# Altium footprint library Angler.PcbLib: 331 footprints (part 12 of 21)
Each footprint in its own frame and in the unit in brackets; x right, y up, seen from the top. Pads: shape width x height; smd on the part's side, far side on the other; paste and mask are expansions set on the pad; w line width, h text height; cw(c..) or ccw(c..) is an arc to the next point about the centre after c.
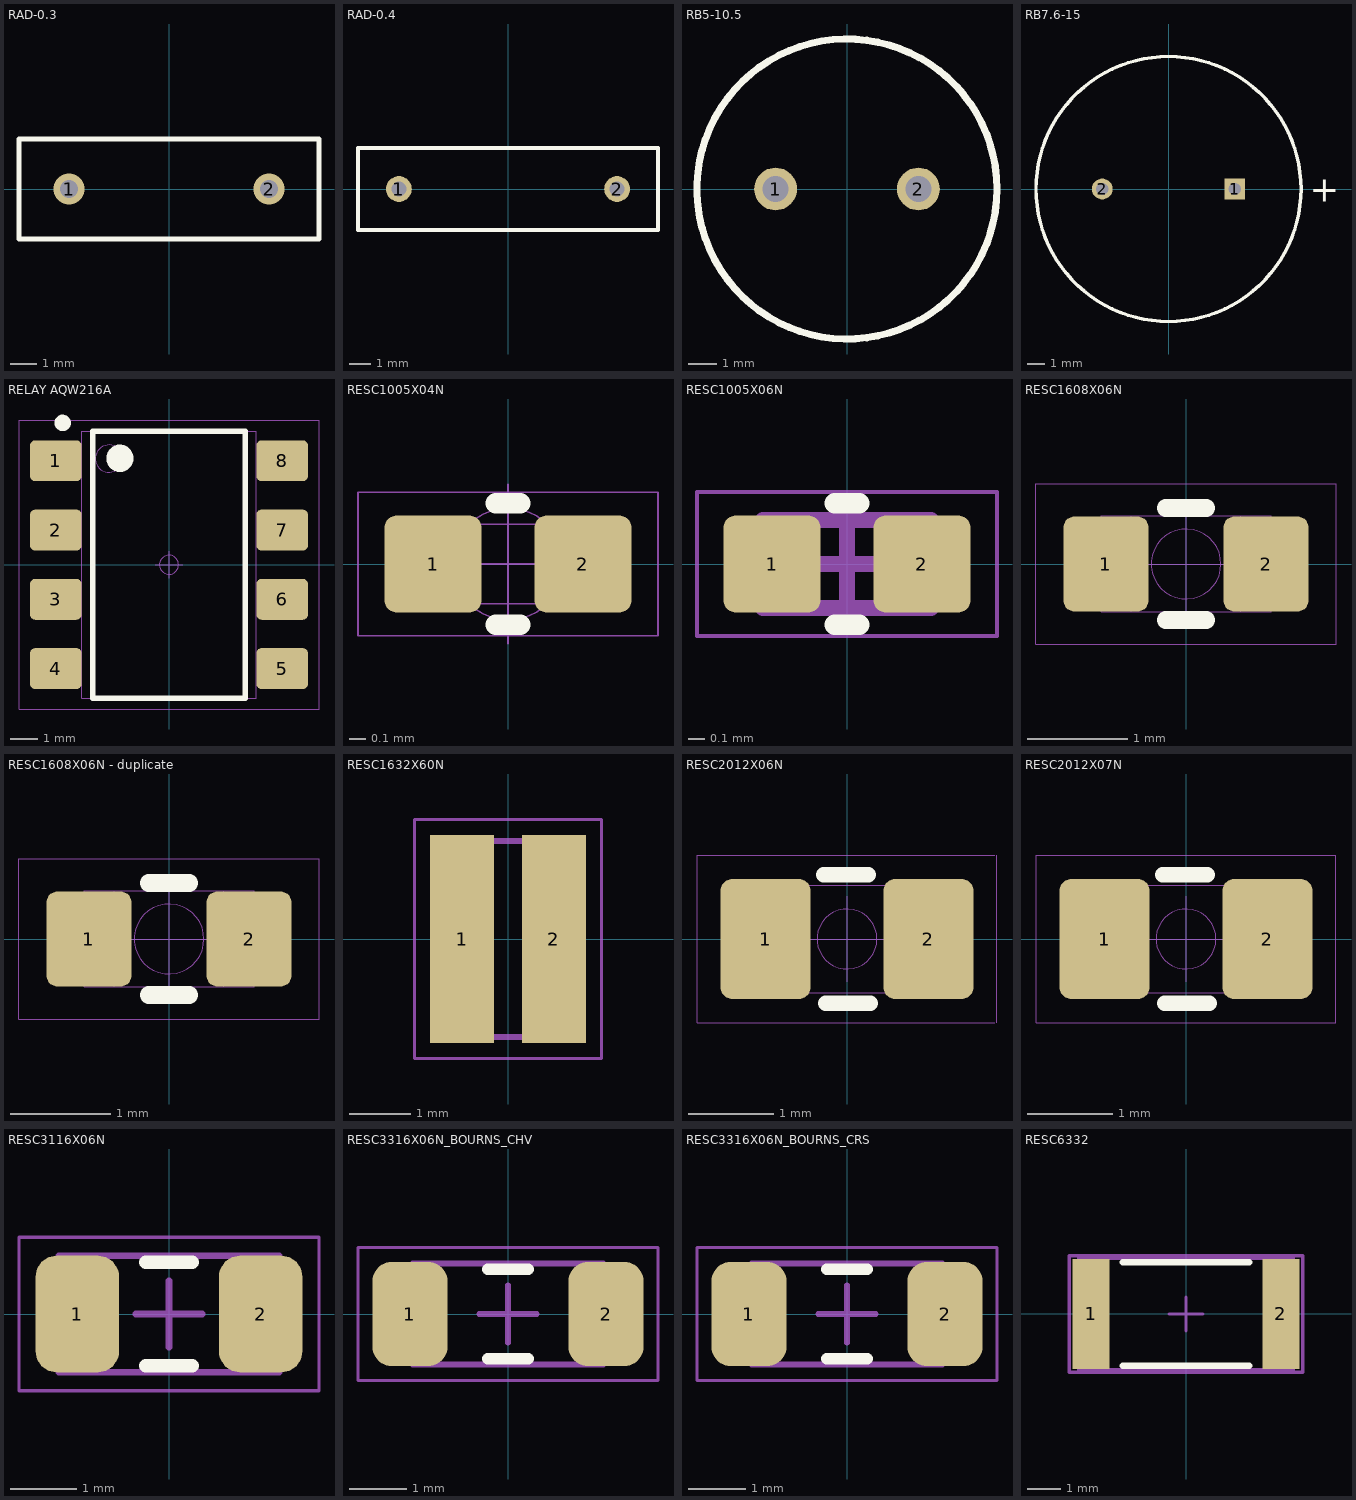
[diagram p11: the footprints below, top view; thin cyan lines are the x and y axes]

## RAD-0.3 [mm] "Radial Cap, Thru-Hole; 2 Leads; 0.3 in Pin Spacing"
height 6
pads (2):
  round 1.2 hole 0.7: 1(-3.81,0) 2(3.81,0)
Top Overlay:
  lines w0.2: -5.715,-1.905 -5.715,1.905 5.715,1.905 5.715,-1.905 -5.715,-1.905

## RAD-0.4 [mm] "Radial Cap, Thru-Hole; 2 Leads; 0.4 in Pin Spacing"
pads (2):
  round 1.2 hole 0.7: 1(-5.08,0) 2(5.08,0)
Top Overlay:
  lines w0.2: -6.985,-1.905 6.985,-1.905 6.985,1.905 -6.985,1.905 -6.985,-1.905

## RB5-10.5 [mm] "Capacitor (Radial); 2 Leads"
pads (2):
  round 1.5 hole 0.9: 1(-2.5,0) 2(2.5,0)
Top Overlay:
  circle w0.25: c0,0 r5.25
Mechanical 1:
  circle w0.02: c0,0 r5.25

## RB7.6-15 [mm] "Polarized Capacitor (Radial); 2 Leads"
pads (2):
  rect 1.2x1.2 hole 0.7: 1(3.81,0)
  round 1.2 hole 0.7: 2(-3.81,0)
Top Overlay:
  circle w0.2: c0,0 r7.62
  text "+" at 8.132,-0.737 h1.5

## RELAY AQW216A [mm] "Compact DIP8-pin type, SMD"
height 3.6
pads (8):
  rrect25% 1.9x1.5 smd mask+0.064: 1(-4.15,3.81) 2(-4.15,1.27) 3(-4.15,-1.27) 4(-4.15,-3.81) 5(4.15,-3.81) 6(4.15,-1.27) 7(4.15,1.27) 8(4.15,3.81)
Top Overlay:
  circle w0.5: c-1.8,3.9 r0.25
  circle w0.3: c-3.9,5.2 r0.15
  lines w0.2: -2.8,-4.89 -2.8,4.89 2.8,4.89 2.8,-4.89 -2.8,-4.89
Mechanical 9:
  circle w0.01: c-2.2,3.89 r0.5
  lines w0.01: -3.2,-4.89 3.2,-4.89 3.2,4.89 -3.2,4.89 -3.2,-4.89
Mechanical 11:
  text ".Designator" at -2.8,-1.1 h3
Mechanical 15:
  circle w0.01: c0,0 r0.35
  lines w0.01: -0.5,0 0.5,0 ; 0,-0.5 0,0.5 ; -5.5,-5.3 -5.5,5.3 5.5,5.3 5.5,-5.3 -5.5,-5.3
3D body: height 3.6, standoff 0.2, extent -3.2,-4.89 3.2,4.89

## RESC1005X04N [mil] "0402, Body 1.0x0.5x0.4mmmm, IPC Medium Density"
height 15.75
pads (2):
  rrect25% 24x24 smd paste+0 mask+2: 1(-18.5,0) 2(18.5,0)
Top Overlay:
  lines w5: -3.01,-15.01 2.99,-15.01 ; -3,15 3,15
Mechanical 9:
  lines w0.39: -7.87,-9.84 -7.87,9.84 ; 7.87,-9.84 7.87,9.84 ; -21.65,-9.84 21.65,-9.84 21.65,9.84 -21.65,9.84 -21.65,-9.84
Mechanical 11:
  text ".Designator" at -15.75,-3.94 h19.68
Mechanical 15:
  circle w0.39: c0,0 r13.78
  lines w0.39: -19.68,0 19.68,0 ; 0,-19.68 0,19.68 ; -37,-17.72 -37,17.72 37,17.72 37,-17.72 -37,-17.72
3D body "RESC1005X04N.step": height 15.75, standoff 0, extent -20.67,-10.82 20.67,10.83

## RESC1005X06N [mil] "0402, Body 1.00x0.50mx0.55m, IPC Medium Density"
height 21.65
pads (2):
  rrect25% 24x24 smd mask+2: 1(-18.5,0) 2(18.5,0)
Top Overlay:
  lines w5: -3.01,-15.01 2.99,-15.01 ; -3,15 3,15
Mechanical 9:
  lines w3.94: -20.67,-10.83 20.67,-10.83 20.67,10.83 -20.67,10.83 -20.67,-10.83
Mechanical 11:
  text "'.Designator'" at -9.84,-2.95 h4.92
Mechanical 15:
  lines w1: -37,-17.72 37,-17.72 37,17.72 -37,17.72 -37,-17.72
  lines w3.94: -10.83,0 10.83,0 ; 0,-10.83 0,10.83
3D body "RESC1005X06N.step": height 21.65, standoff 0, extent -20.67,-10.83 20.67,10.83

## RESC1608X06N [mm] "0603, Body 1.5x0.8x0.55mm, IPC Medium Density"
height 0.55
pads (2):
  rrect25% 0.85x0.95 smd paste+0 mask+0.064: 1(-0.8,0) 2(0.8,0)
Top Overlay:
  lines w0.178: -0.203,-0.559 0.203,-0.559 ; -0.203,0.559 0.203,0.559
Mechanical 9:
  lines w0.01: -0.55,-0.48 -0.55,0.475 ; 0.55,-0.48 0.55,0.475 ; -0.85,-0.48 -0.85,0.48 0.85,0.48 0.85,-0.48 -0.85,-0.48
Mechanical 11:
  text ".Designator" at -0.8,-0.3 h1
Mechanical 15:
  circle w0.01: c0,0 r0.35
  lines w0.01: -0.5,0 0.5,0 ; 0,-0.5 0,0.5 ; -1.5,-0.8 1.5,-0.8 1.5,0.8 -1.5,0.8 -1.5,-0.8
3D body "RESC1608X06N.step": height 0.55, standoff 0, extent -0.85,-0.45 0.85,0.45

## RESC1608X06N - duplicate [mm] "0603, Body 1.5x0.8x0.55mm, IPC Medium Density"
height 0.55
pads (2):
  rrect25% 0.85x0.95 smd paste+0 mask+0.064: 1(-0.8,0) 2(0.8,0)
Top Overlay:
  lines w0.178: -0.203,-0.559 0.203,-0.559 ; -0.203,0.559 0.203,0.559
Mechanical 9:
  lines w0.01: -0.55,-0.48 -0.55,0.475 ; 0.55,-0.48 0.55,0.475 ; -0.85,-0.48 -0.85,0.48 0.85,0.48 0.85,-0.48 -0.85,-0.48
Mechanical 11:
  text ".Designator" at -0.8,-0.3 h1
Mechanical 15:
  circle w0.01: c0,0 r0.35
  lines w0.01: -0.5,0 0.5,0 ; 0,-0.5 0,0.5 ; -1.5,-0.8 1.5,-0.8 1.5,0.8 -1.5,0.8 -1.5,-0.8
3D body "RESC1608X06N.step": height 0.55, standoff 0, extent -0.85,-0.45 0.85,0.45

## RESC1632X60N [mm]
pads (2):
  rect 1.05x3.4 smd: 1(-0.75,0) 2(0.75,0)
Mechanical 13:
  lines w0.1: -0.8,-1.6 0.8,-1.6 0.8,1.6 -0.8,1.6 -0.8,-1.6
Mechanical 15:
  lines w0.05: -1.525,-1.95 1.525,-1.95 1.525,1.95 -1.525,1.95 -1.525,-1.95
3D body "PRL1632-R013-F-T1.stp": height 0.6, standoff 0, extent -0.8,-1.6 0.8,1.6

## RESC2012X06N [mm] "0805, Body 2.0x1.3x0.6mm, IPC Medium Density"
height 0.6
pads (2):
  rrect25% 1.05x1.4 smd paste+0 mask+0.064: 1(-0.95,0) 2(0.95,0)
Top Overlay:
  lines w0.178: -0.275,0.75 0.25,0.75 ; -0.25,-0.75 0.275,-0.75
Mechanical 9:
  lines w0.01: -0.8,-0.625 -0.8,0.625 ; 0.8,-0.625 0.8,0.625 ; -1.1,-0.625 -1.1,0.625 1.1,0.625 1.1,-0.625 -1.1,-0.625
Mechanical 11:
  text "'.Designator'" at -0.8,-0.3 h0.5
Mechanical 15:
  circle w0.01: c0,0 r0.35
  lines w0.01: -0.5,0 0.5,0 ; 0,-0.5 0,0.5 ; 1.725,-0.975 -1.75,-0.975 -1.75,0.975 1.725,0.975 ; 1.75,-0.975 1.75,0.975
3D body "RESC2012X06N.step": height 0.6, standoff 0, extent -1.1,-0.675 1.1,0.675

## RESC2012X07N [mm] "0805, Body 2.0x1.3x0.7mm, IPC Medium Density"
height 0.7
pads (2):
  rrect25% 1.05x1.4 smd paste+0 mask+0.064: 1(-0.95,0) 2(0.95,0)
Top Overlay:
  lines w0.178: -0.275,0.75 0.25,0.75 ; -0.25,-0.75 0.275,-0.75
Mechanical 9:
  lines w0.01: -0.8,-0.625 -0.8,0.625 ; 0.8,-0.625 0.8,0.625 ; -1.1,-0.625 -1.1,0.625 1.1,0.625 1.1,-0.625 -1.1,-0.625
Mechanical 11:
  text "'.Designator'" at -0.8,-0.3 h0.5
Mechanical 15:
  circle w0.01: c0,0 r0.35
  lines w0.01: -0.5,0 0.5,0 ; 0,-0.5 0,0.5 ; -1.75,-0.975 -1.75,0.975 1.75,0.975 1.75,-0.975 -1.75,-0.975
3D body "RESC2012X07N.step": height 0.7, standoff 0, extent -1.1,-0.675 1.1,0.675

## RESC3116X06N [mm] "1206, Body 3.10x1.60x0.65mm, IPC Medium Density"
height 0.65
pads (2):
  rrect50% 1.25x1.75 smd: 1(-1.375,0) 2(1.375,0)
Top Overlay:
  lines w0.2: -0.35,-0.775 0.35,-0.775 ; -0.35,0.775 0.35,0.775
Mechanical 9:
  lines w0.1: -1.65,-0.875 1.65,-0.875 1.65,0.875 -1.65,0.875 -1.65,-0.875
Mechanical 11:
  text ".Designator" at -0.525,-0.2 h0.5
Mechanical 15:
  lines w0.05: -2.25,-1.15 2.25,-1.15 2.25,1.15 -2.25,1.15 -2.25,-1.15
  lines w0.1: -0.5,0 0.5,0 ; 0,-0.5 0,0.5
3D body "RESC3116X06N.step": height 0.65, standoff 0, extent -1.65,-0.875 1.65,0.875

## RESC3316X06N_BOURNS_CHV [mm] "1206, Body 3.20x1.60x0.65mm, IPC Medium Density, Bourns CHV Family"
height 0.65
pads (2):
  rrect50% 1.3x1.8 smd: 1(-1.7,0) 2(1.7,0)
Top Overlay:
  lines w0.2: -0.35,-0.775 0.35,-0.775 ; -0.35,0.775 0.35,0.775
Mechanical 9:
  lines w0.1: -1.65,-0.875 -1.65,0.875 1.65,0.875 1.65,-0.875 -1.65,-0.875
Mechanical 11:
  text ".Designator" at -0.525,-0.2 h0.5
Mechanical 15:
  lines w0.05: -2.6,-1.15 -2.6,1.15 2.6,1.15 2.6,-1.15 -2.6,-1.15
  lines w0.1: -0.5,0 0.5,0 ; 0,-0.5 0,0.5
3D body: height 0.6, standoff 0, extent -1.6,-0.8 1.6,0.8

## RESC3316X06N_BOURNS_CRS [mm] "1206, Body 3.20x1.60x0.65mm, IPC Medium Density, Bourns CRS Family"
height 0.65
pads (2):
  rrect50% 1.3x1.8 smd: 1(-1.7,0) 2(1.7,0)
Top Overlay:
  lines w0.2: -0.35,-0.775 0.35,-0.775 ; -0.35,0.775 0.35,0.775
Mechanical 9:
  lines w0.1: -1.65,-0.875 1.65,-0.875 1.65,0.875 -1.65,0.875 -1.65,-0.875
Mechanical 11:
  text ".Designator" at -0.525,-0.2 h0.5
Mechanical 15:
  lines w0.05: -2.6,-1.15 2.6,-1.15 2.6,1.15 -2.6,1.15 -2.6,-1.15
  lines w0.1: -0.5,0 0.5,0 ; 0,-0.5 0,0.5
3D body: height 0.6, standoff 0, extent -1.6,-0.8 1.6,0.8

## RESC6332 [mm] "Chip Resistor, Body 6.3x3.2mm, IPC High Density"
height 0.9
pads (2):
  rect 1.1x3.3 smd: 1(-2.85,0) 2(2.85,0)
Top Overlay:
  lines w0.2: -1.9,-1.55 1.9,-1.55 ; -1.9,1.55 1.9,1.55
Mechanical 13:
  lines w0.1: -3.225,-1.675 3.225,-1.675 3.225,1.675 -3.225,1.675 -3.225,-1.675
Mechanical 15:
  lines w0.1: -0.5,0 0.5,0 ; 0,-0.5 0,0.5 ; -3.5,-1.75 3.5,-1.75 3.5,1.75 -3.5,1.75 -3.5,-1.75
3D body: height 0.9, standoff 0, extent -3.225,-1.675 3.225,1.675